# Altium footprint library UP-ROBOT Devices(2013-02-26).PcbLib: 150 footprints (part 1 of 10)
Each footprint in its own frame and in the unit in brackets; x right, y up, seen from the top. Pads: shape width x height; smd on the part's side, far side on the other; paste and mask are expansions set on the pad; w line width, h text height; cw(c..) or ccw(c..) is an arc to the next point about the centre after c.
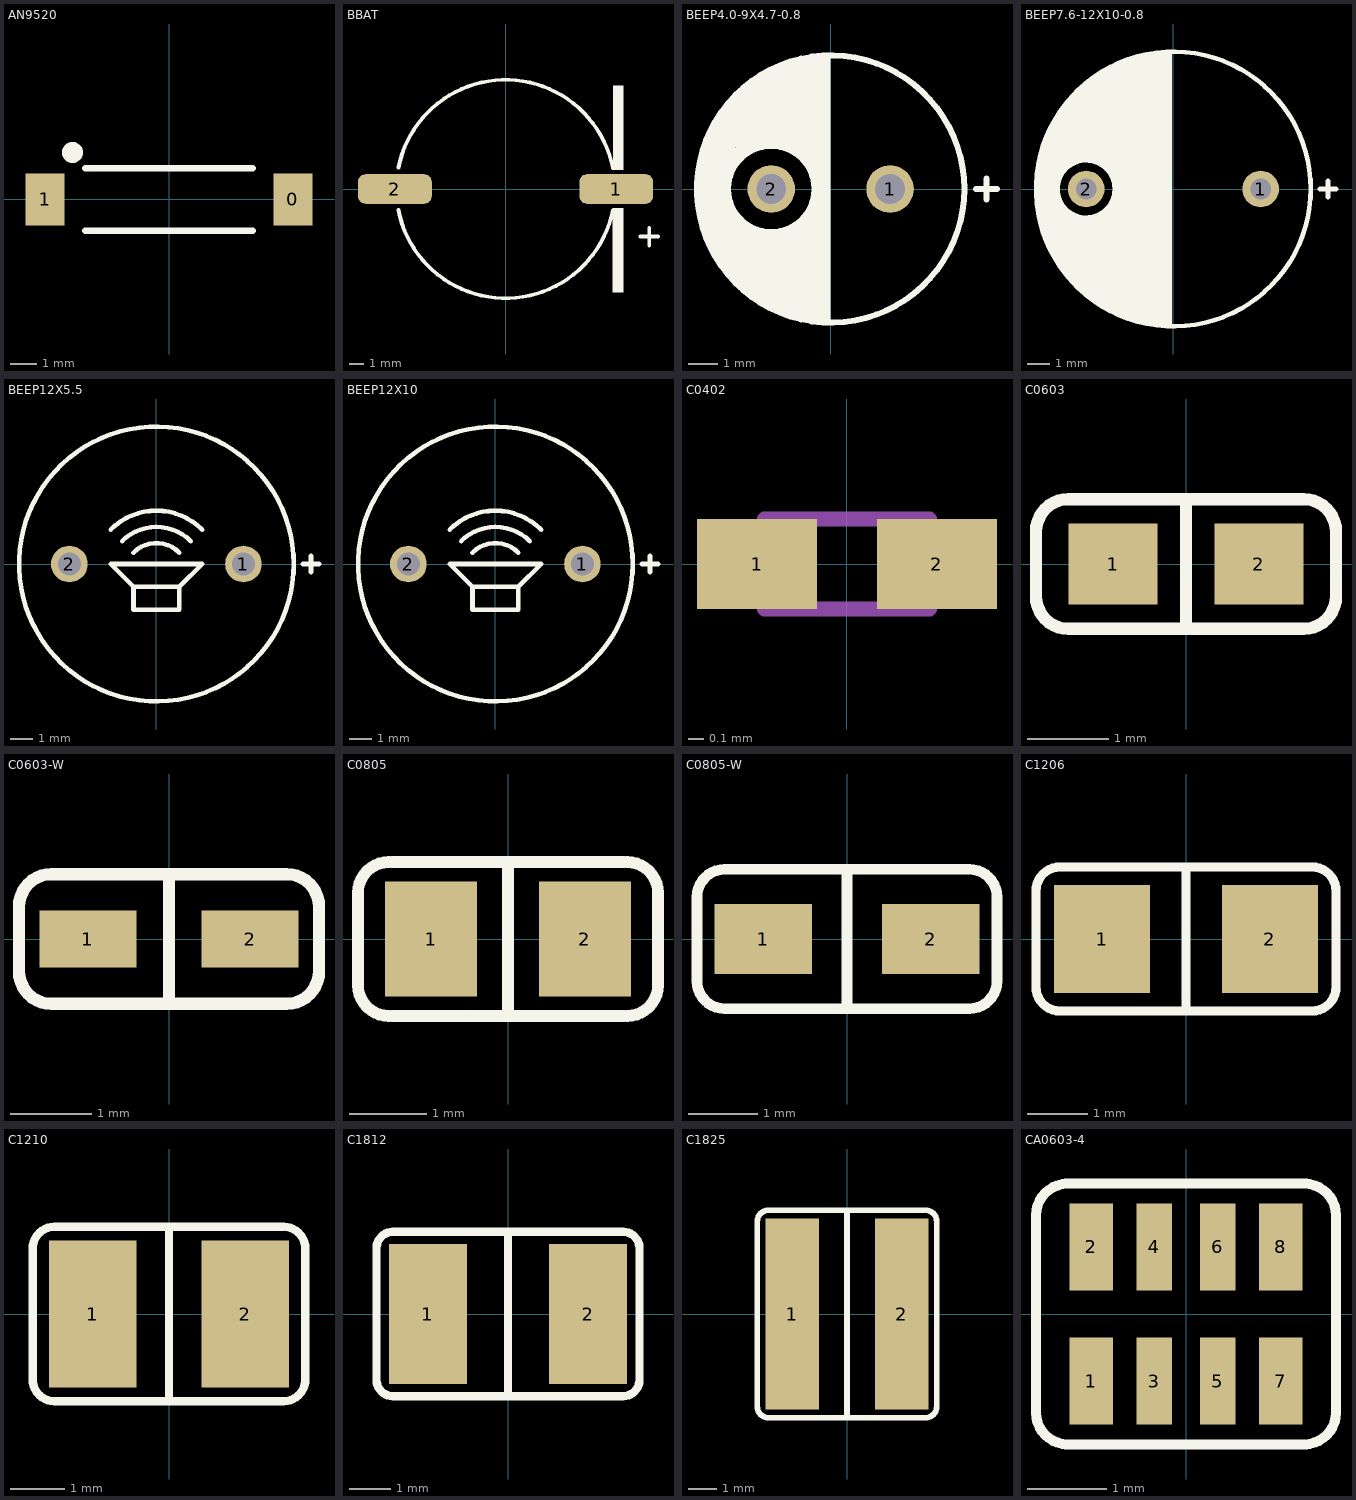
[diagram p0: the footprints below, top view; thin cyan lines are the x and y axes]

## AN9520 [mm]
pads (2):
  rect 1.5x2 smd: 0(4.75,0) 1(-4.75,0)
Top Overlay:
  circle w0.4: c-3.7,1.8 r0.2
  lines w0.254: -3.2,-1.2 3.2,-1.2 ; -3.2,1.2 3.2,1.2
3D body: height 1, standoff 0, extent -4.8,-1 4.7,1

## BBAT [mm]
pads (2):
  rrect50% 5x2 smd: 1(7.5,0) 2(-7.5,0)
Top Overlay:
  rectangle: 7.275,1.3 8,7
  region: 7.975,-1.3 7.25,-1.3 7.25,-7.025 7.975,-7.025
  lines w0.254: -7.26,-1.43 ccw(c0,0) 7.26,-1.432 ; -7.26,1.432 cw(c0,0) 7.26,1.43 ; 9.125,-3.225 10.325,-3.225 ; 9.725,-3.825 9.725,-2.625

## BEEP4.0-9X4.7-0.8 [mm]
pads (2):
  round 1.6 hole 1: 1(2,0) 2(-2,0)
Top Overlay:
  circle w0.2: c0,0 r4.5
  circle w0.5: c-2,0 r1.603
  rectangle: -0.6,-4.4 0,4.4
  rectangle: -2.6,1.4 -0.5,3.5
  rectangle: -3.4,1.4 -2.5,2.4
  rectangle: -0.9,1.1 -0.4,1.7
  rectangle: -3.4,-2.4 -2.4,-1.3
  rectangle: -2.5,-3.8 -0.4,-1.6
  rectangle: -2.8,-2.6 -2.2,-2.2
  rectangle: -1.1,-1.9 -0.4,-1.1
  lines w0.203: 4.9,0 5.25,0 ; 5.25,-0.35 5.25,0 ; 5.25,0.35 5.25,0 ; 5.6,0 5.25,0
  lines w1: -0.608,3.953 ccw(c0,0) -0.593,-3.956
3D body: height 4.7, standoff -5, extent -4.5,-4.5 4.5,4.5

## BEEP7.6-12X10-0.8 [mm]
pads (2):
  round 1.6 hole 0.9: 1(3.81,0) 2(-3.81,0)
Top Overlay:
  circle w0.5: c-3.81,0 r1.4
  circle w0.2: c0,0 r6
  rectangle: -5.15,1.2 -2.6,1.75
  rectangle: -2.75,-1.45 -2.15,-0.9
  rectangle: -4.1,-4.4 -1.8,-3
  rectangle: -5,-3.15 -2.2,-1.2
  rectangle: -4.3,2.6 -2.3,4.15
  rectangle: -5.05,1.35 -2.65,2.85
  rectangle: -2.85,0.85 -2,4.6
  lines w0.2: -5.918,-0.711 -5.918,0.737 ; -5.766,-1.6 -5.766,1.524 ; -5.588,-2.134 -5.588,2.083 ; -5.41,-2.565 -5.41,2.489 ; -5.232,-2.896 -5.232,2.845 ; -2.413,-5.461 -2.413,5.461 ; -2.235,-5.537 -2.235,5.537 ; -2.083,-5.613 -2.083,5.563 ; -1.905,-5.69 -1.905,5.639 ; -1.727,-5.74 -1.727,5.74 ; -1.549,-5.766 -1.549,5.791 ; -1.372,-5.817 -1.372,5.817 ; -1.194,-5.867 -1.194,5.867 ; -1.016,-5.893 -1.016,5.893 ; -0.838,-5.918 -0.838,5.918 ; -0.686,-5.944 -0.686,5.944 ; -0.508,-5.944 -0.508,5.944 ; -0.33,-5.969 -0.33,5.944 ; -0.152,-5.994 -0.152,5.969
  lines w0.203: 6.4,0 6.75,0 ; 6.75,-0.35 6.75,0 ; 6.75,0.35 6.75,0 ; 7.1,0 6.75,0
  lines w1: -0.694,-5.456 cw(c0,0) -0.646,5.462
3D body: height 10.1, standoff -2.45, extent -6,-6 6,6

## BEEP12X5.5 [mm]
height 5.5
pads (2):
  round 1.6 hole 1: 1(3.8,0) 2(-3.8,0)
Top Overlay:
  circle w0.2: c0,0 r6
  lines w0.2: -2,1.5 cw(c0,-0.5) 2,1.5 ; -1.5,1 cw(c0,-0.5) 1.5,1 ; -1,0.5 cw(c0,-0.5) 1,0.5 ; -1,-1 -2,0 2,0 1,-1 ; -1,-1 -1,-2 1,-2 1,-1 ; -1,-1 1,-1
  lines w0.203: 6.4,0 6.75,0 ; 6.75,-0.35 6.75,0 ; 6.75,0.35 6.75,0 ; 7.1,0 6.75,0
3D body: height 5.55, standoff -3.45, extent -6,-6 6,6

## BEEP12X10 [mm]
height 10
pads (2):
  round 1.6 hole 1: 1(3.8,0) 2(-3.8,0)
Top Overlay:
  circle w0.2: c0,0 r6
  lines w0.2: -2,1.5 cw(c0,-0.5) 2,1.5 ; -1.5,1 cw(c0,-0.5) 1.5,1 ; -1,0.5 cw(c0,-0.5) 1,0.5 ; -1,-1 -2,0 2,0 1,-1 ; -1,-1 -1,-2 1,-2 1,-1 ; -1,-1 1,-1
  lines w0.203: 6.4,0 6.75,0 ; 6.75,-0.35 6.75,0 ; 6.75,0.35 6.75,0 ; 7.1,0 6.75,0
3D body: height 10.1, standoff -2.45, extent -6,-6 6,6

## C0402 [mm] "Chip Capacitor, 2-Leads, Body 1.0x0.5mm, IPC Medium Density"
height 0.5
pads (2):
  rect 0.8x0.6 smd: 1(-0.6,0) 2(0.6,0)
Mechanical 13:
  lines w0.1: -0.55,-0.3 -0.55,0.3 0.55,0.3 0.55,-0.3 -0.55,-0.3
3D body: height 0.49, standoff -0.01, extent -0.5,-0.25 0.5,0.25

## C0603 [mm]
height 0.762
pads (2):
  rect 1.1x1 smd: 1(-0.9,0) 2(0.9,0)
Top Overlay:
  lines w0.152: 0,-0.8 0,0.8 ; 0,0.8 1.45,0.8 cw(c1.45,0.4) 1.85,0.4 1.85,-0.4 cw(c1.45,-0.4) 1.45,-0.8 -1.45,-0.8 cw(c-1.45,-0.4) -1.85,-0.4 -1.85,0.4 cw(c-1.45,0.4) -1.45,0.8 0,0.8
3D body: height 0.46, standoff 0, extent -0.762,-0.386 0.762,0.381

## C0603-W [mm]
pads (2):
  rect 1.2x0.7 smd: 1(-1,0) 2(1,0)
Top Overlay:
  lines w0.152: 0,-0.8 0,0.8 ; 0,0.8 -1.45,0.8 ccw(c-1.45,0.4) -1.85,0.4 -1.85,-0.4 ccw(c-1.45,-0.4) -1.45,-0.8 1.45,-0.8 ccw(c1.45,-0.4) 1.85,-0.4 1.85,0.4 ccw(c1.45,0.4) 1.45,0.8 0,0.8
3D body: height 0.46, standoff 0, extent -0.762,-0.386 0.762,0.381

## C0805 [mm]
pads (2):
  rect 1.2x1.5 smd: 1(-1,0) 2(1,0)
Top Overlay:
  lines w0.152: -1.55,-1 cw(c-1.55,-0.6) -1.95,-0.6 -1.95,0.6 cw(c-1.55,0.6) -1.55,1 ; -1.5,-1 1.5,-1 ; -1.5,1 1.5,1 ; 0,-1 0,1 ; 1.55,-1 ccw(c1.55,-0.6) 1.95,-0.6 1.95,0.6 ccw(c1.55,0.6) 1.55,1
3D body: height 0.61, standoff 0, extent -1.016,-0.638 1.016,0.638

## C0805-W [mm]
pads (2):
  rect 1.4x1 smd: 1(-1.2,0) 2(1.2,0)
Top Overlay:
  lines w0.152: -1.75,-1 cw(c-1.75,-0.6) -2.15,-0.6 -2.15,0.6 cw(c-1.75,0.6) -1.75,1 ; -1.7,-1 1.7,-1 ; -1.7,1 1.7,1 ; 0,-1 0,1 ; 1.75,-1 ccw(c1.75,-0.6) 2.15,-0.6 2.15,0.6 ccw(c1.75,0.6) 1.75,1
3D body: height 0.61, standoff 0, extent -1.016,-0.638 1.016,0.638

## C1206 [mm]
pads (2):
  rect 1.6x1.8 smd: 1(-1.4,0) 2(1.4,0)
Top Overlay:
  lines w0.152: 0,-1.2 0,1.2 ; -2.5,-0.8 ccw(c-2.1,-0.8) -2.1,-1.2 2.1,-1.2 ccw(c2.1,-0.8) 2.5,-0.8 2.5,0.8 ccw(c2.1,0.8) 2.1,1.2 -2.1,1.2 ccw(c-2.1,0.8) -2.5,0.8 -2.5,-0.8
3D body: height 0.61, standoff 0, extent -1.524,-0.818 1.524,0.711

## C1210 [mm]
pads (2):
  rect 1.6x2.7 smd: 1(-1.4,0) 2(1.4,0)
Top Overlay:
  lines w0.152: 0,-1.6 0,1.6 ; -2.5,-1.2 ccw(c-2.1,-1.2) -2.1,-1.6 2.1,-1.6 ccw(c2.1,-1.2) 2.5,-1.2 2.5,1.2 ccw(c2.1,1.2) 2.1,1.6 -2.1,1.6 ccw(c-2.1,1.2) -2.5,1.2 -2.5,-1.2

## C1812 [mm]
pads (2):
  rect 1.9x3.4 smd: 1(-1.95,0) 2(1.95,0)
Top Overlay:
  lines w0.203: 0,-2 0,2 ; -3.2,-1.6 ccw(c-2.8,-1.6) -2.8,-2 2.8,-2 ccw(c2.8,-1.6) 3.2,-1.6 3.2,1.6 ccw(c2.8,1.6) 2.8,2 -2.8,2 ccw(c-2.8,1.6) -3.2,1.6 -3.2,-1.6
3D body: height 1.88, standoff 0, extent -2.286,-1.524 2.286,1.529

## C1825 [mm]
pads (2):
  rect 1.9x6.8 smd: 1(-1.95,0) 2(1.95,0)
Top Overlay:
  lines w0.203: 0,-3.7 0,3.7 ; -3.2,-3.3 ccw(c-2.8,-3.3) -2.8,-3.7 2.8,-3.7 ccw(c2.8,-3.3) 3.2,-3.3 3.2,3.3 ccw(c2.8,3.3) 2.8,3.7 -2.8,3.7 ccw(c-2.8,3.3) -3.2,3.3 -3.2,-3.3

## CA0603-4 [mm]
pads (8):
  rect 0.55x1.1 smd: 1(-1.2,-0.85) 2(-1.2,0.85) 7(1.2,-0.85) 8(1.2,0.85)
  rect 0.45x1.1 smd: 3(-0.4,-0.85) 4(-0.4,0.85) 5(0.4,-0.85) 6(0.4,0.85)
Top Overlay:
  lines w0.127: -1.524,-1.65 1.524,-1.65 ; -1.524,1.65 1.524,1.65 ; -1.5,-1.65 cw(c-1.5,-1.25) -1.9,-1.25 -1.9,1.25 cw(c-1.5,1.25) -1.5,1.65 ; 1.5,-1.65 ccw(c1.5,-1.25) 1.9,-1.25 1.9,1.25 ccw(c1.5,1.25) 1.5,1.65
3D body: height 0.55, standoff 0, extent -1.6,-0.862 1.6,0.838